# Altium footprint library PCBLIB.PcbLib: 775 footprints (part 19 of 49)
Each footprint in its own frame and in the unit in brackets; x right, y up, seen from the top. Pads: shape width x height; smd on the part's side, far side on the other; paste and mask are expansions set on the pad; w line width, h text height; cw(c..) or ccw(c..) is an arc to the next point about the centre after c.
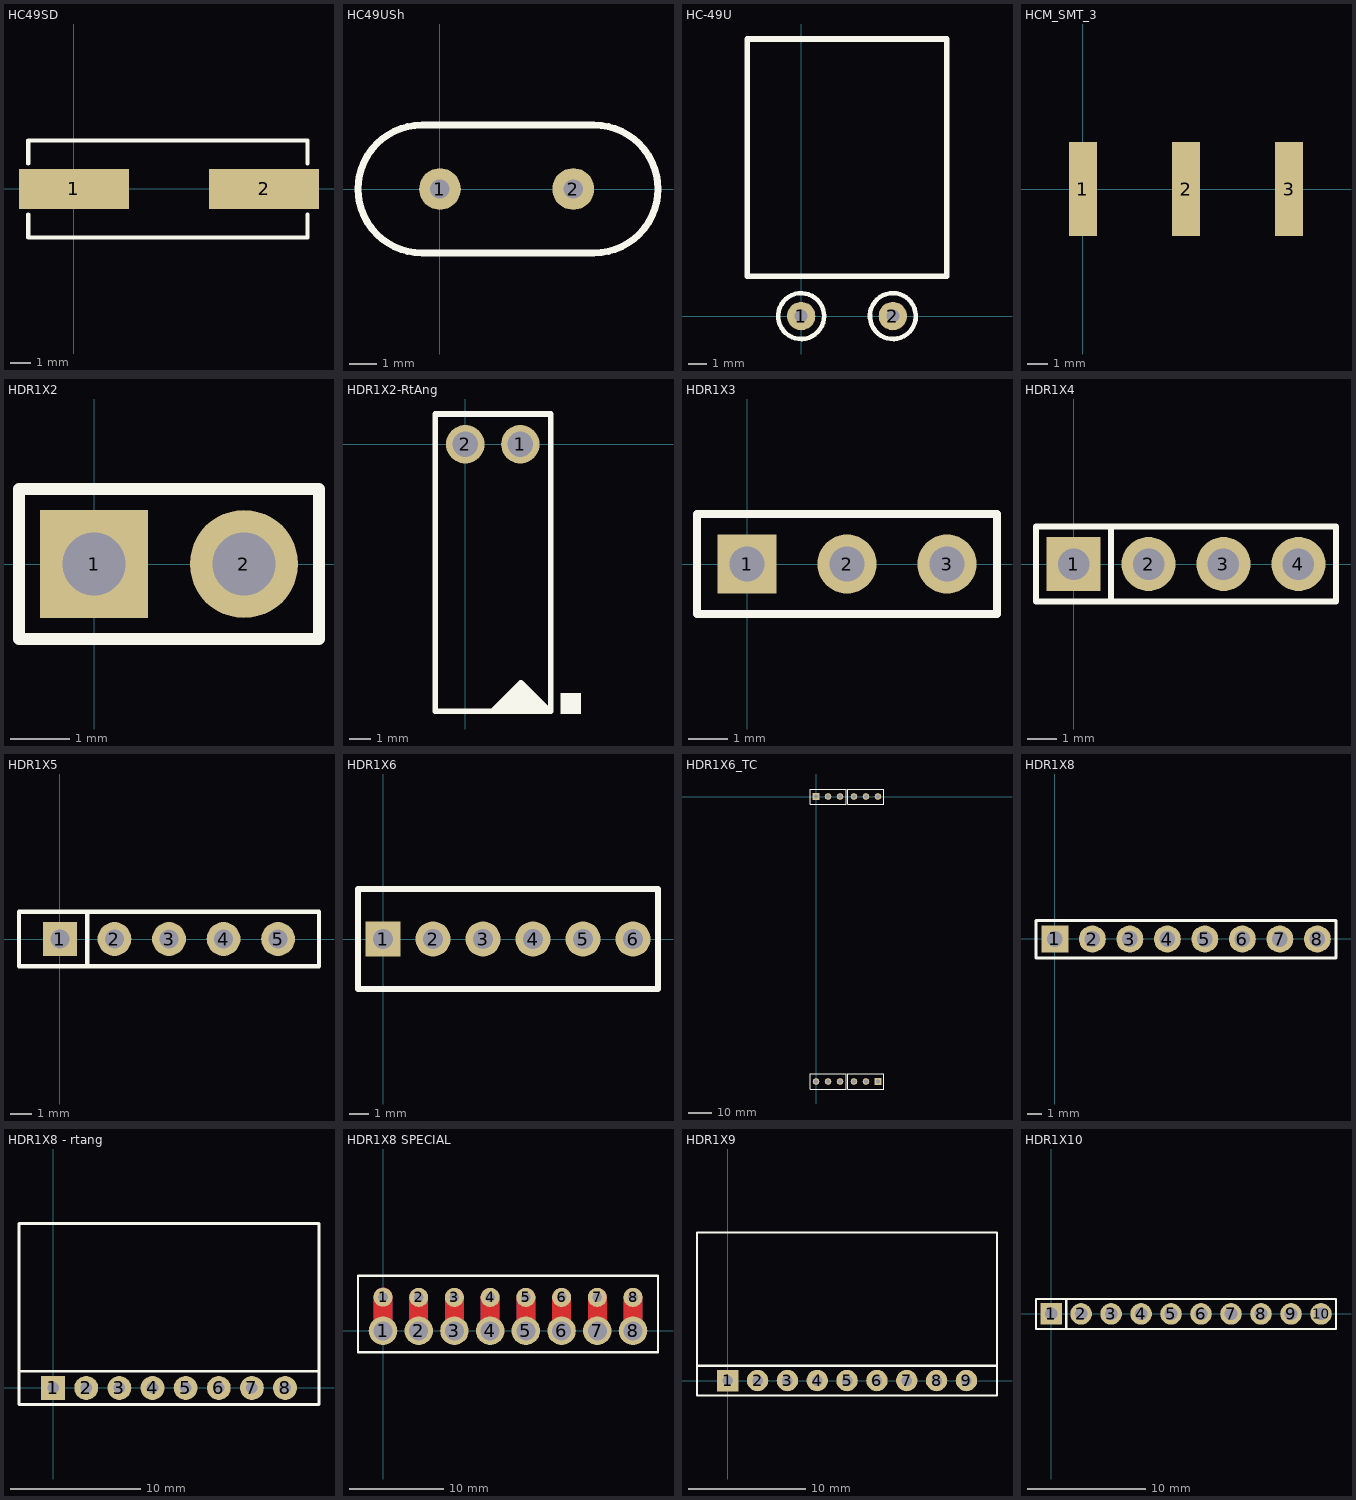
[diagram p18: the footprints below, top view; thin cyan lines are the x and y axes]

## HC49SD [mm]
pads (2):
  rect 5.5x2 smd: 1(0,0) 2(9.5,0)
TopOverlay:
  lines w0.203: -2.286,-2.42 7.544,-2.42 11.684,-2.42 11.684,-1.27 ; -2.286,-2.395 -2.286,-1.27 ; -2.286,1.27 -2.286,2.395 ; -2.286,2.42 6.782,2.42 11.684,2.42 11.684,1.27

## HC49USh [mil]
pads (2):
  round 60 hole 28: 1(0,0) 2(192,0)
TopOverlay:
  lines w10: -26,-92 cw(c-26,0) -26,92 -4,92 174,92 222,92 cw(c222,0) 222,-92 159,-92 10,-92 -26,-92

## HC-49U [mil]
pads (2):
  round 62 hole 28: 1(0,0) 2(200,0)
TopOverlay:
  circle w10: c0,0 r50
  lines w10: 249.96,1.96 ccw(c200,0) 250,0
  lines w12: -117,87 -117,604 317,604 317,87 -117,87
Mechanical4:
  text ".155" at 0,0 h1

## HCM_SMT_3 [mil] "Through Hole to SMT Connector"
pads (3):
  rect 54x182 smd: 1(0,0) 2(200,0) 3(400,0)
TopOverlay:
  text "." at -6.66,110 h80
  text "." at 193.34,110 h80
  text "." at 393.34,110 h80

## HDR1X2 [mil]
height 390
pads (2):
  rect 72x72 hole 42: 1(0,0)
  round 72 hole 42: 2(100,0)
TopOverlay:
  lines w8: -50,-50 -50,50 150,50 150,-50 -50,-50
Mechanical4:
  text ".341" at 0,0 h1

## HDR1X2-RtAng [mil]
height 275
pads (2):
  round 70 hole 46: 1(100,0) 2(0,0)
TopOverlay:
  rectangle: 173,-490 210,-452
  lines w10: 49,-485 101,-433 153,-485 155,-485 ; 62,-485 62,-484 101,-445 137,-481 79.82,-481 74.8,-481 103.11,-452.69 103.11,-457.11 124,-478 93.82,-478 86.17,-470.35 108.26,-470.35 96.89,-458.98 ; 155,-485 -55,-485 -55,55 155,55 155,-485

## HDR1X3 [mm]
pads (3):
  rect 1.5x1.5 hole 0.9: 1(0,0)
  round 1.5 hole 0.9: 2(2.54,0) 3(5.08,0)
TopOverlay:
  lines w0.2: -1.27,-1.27 6.35,-1.27 6.35,1.27 -1.27,1.27 -1.27,-1.27

## HDR1X4 [mil]
height 390
pads (4):
  rect 72x72 hole 42: 1(0,0)
  round 72 hole 42: 2(100,0) 3(200,0) 4(300,0)
TopOverlay:
  lines w8: 50,-50 50,50 ; -50,-50 -50,50 350,50 350,-50 -50,-50
Mechanical4:
  text ".341" at 0,-0.23 h1
  text ".341" at 0,0 h1

## HDR1X5 [mil]
height 10
pads (5):
  rect 62x62 hole 35: 1(0,0)
  round 62 hole 35: 2(100,0) 3(200,0) 4(300,0) 5(400,0)
TopOverlay:
  lines w8: 50,-50 50,50 ; -75,-50 -75,50 475,50 475,-50 -75,-50
Mechanical4:
  text ".358" at 0,0 h1

## HDR1X6 [mil]
pads (6):
  rect 70x70 hole 40: 1(0,0)
  round 70 hole 40: 2(100,0) 3(200,0) 4(300,0) 5(400,0) 6(500,0)
TopOverlay:
  lines w12: -50,-100 -50,100 550,100 550,-100 -50,-100
Mechanical4:
  text ".4" at 0,0 h1

## HDR1X6_TC [mil]
pads (12):
  rect 110x110 hole 65: 1A(0,0) 1B(1032,-4748)
  round 110 hole 65: 2A(200,0) 2B(832,-4748) 3A(400,0) 3B(632,-4748) 4A(632,0) 4B(400,-4748) 5A(832,0) 5B(200,-4748) 6A(1032,0) 6B(0,-4748)
TopOverlay:
  lines w10: -100,-4873 -100,-4623 500,-4623 500,-4873 -100,-4873 ; -100,-125 -100,125 500,125 500,-125 -100,-125 ; 532,-4873 532,-4623 1132,-4623 1132,-4873 532,-4873 ; 532,-125 532,125 1132,125 1132,-125 532,-125
Mechanical4:
  text ".4" at 1003.5,-4748 h1
  text ".4" at 28.5,0 h1

## HDR1X8 [mil]
height 10
pads (8):
  rect 72x72 hole 42: 1(0,0)
  round 72 hole 42: 2(100,-0.23) 3(200,-0.23) 4(300,-0.23) 5(400,-0.23) 6(500,-0.23) 7(600,-0.23) 8(700,-0.23)
TopOverlay:
  lines w8: -50.25,-50.23 749.75,-50.23 749.75,49.77 -50.25,49.77 -50.25,-50.23
Mechanical4:
  text ".341" at 0,0 h1

## HDR1X8 - rtang [mil]
pads (8):
  rect 72x72 hole 35: 1(0,0)
  round 72 hole 35: 2(100,-0.23) 3(200,-0.23) 4(300,-0.23) 5(400,-0.23) 6(500,-0.23) 7(600,-0.23) 8(700,-0.23)
TopOverlay:
  lines w8: -102.99,49.77 802.48,49.77 ; -102.99,-50.23 802.48,-50.23 802.48,496.06 -102.99,496.06 -102.99,-50.23
Mechanical4:
  text ".341" at 0,0 h1

## HDR1X8 SPECIAL [mil]
height 10
pads (16):
  round 120 hole 80: 1(0,0) 2(150,0) 3(300,0) 4(450,0) 5(600,0) 6(750,0) 7(900,0) 8(1050,0)
  round 80 hole 40: 1(0,141) 2(150,140) 3(300,140) 4(450,140) 5(600,140) 6(750,140) 7(900,140) 8(1050,140)
TopLayer:
  lines w80: 0,0 0,141 ; 150,0 150,140 ; 300,0 300,140 ; 450,0 450,140 ; 600,0 600,140 ; 750,0 750,140 ; 900,0 900,140 ; 1050,0 1050,140
BottomLayer:
  lines w80: 0,0 0,141 ; 150,0 150,140 ; 300,0 300,140 ; 450,0 450,140 ; 600,0 600,140 ; 750,0 750,140 ; 900,0 900,140 ; 1050,0 1050,140
TopOverlay:
  lines w10: -105,-89.5 -105,230.5 1155,230.5 1155,-89.5 -105,-89.5
TopPaste:
  lines w80: 0,0 0,141 ; 150,0 150,140 ; 300,0 300,140 ; 450,0 450,140 ; 600,0 600,140 ; 750,0 750,140 ; 900,0 900,140 ; 1050,0 1050,140
BottomPaste:
  lines w80: 0,0 0,141 ; 150,0 150,140 ; 300,0 300,140 ; 450,0 450,140 ; 600,0 600,140 ; 750,0 750,140 ; 900,0 900,140 ; 1050,0 1050,140
TopSolder:
  lines w80: 0,0 0,141 ; 150,0 150,140 ; 300,0 300,140 ; 450,0 450,140 ; 600,0 600,140 ; 750,0 750,140 ; 900,0 900,140 ; 1050,0 1050,140
BottomSolder:
  lines w80: 0,-4.81 0,141 ; 150,0 150,140 ; 300,0 300,140 ; 450,0 450,140 ; 600,0 600,140 ; 750,0 750,140 ; 900,0 900,140 ; 1050,0 1050,140

## HDR1X9 [mil]
pads (9):
  rect 72x72 hole 35: 1(0,0)
  round 72 hole 35: 2(100,-0.23) 3(200,-0.23) 4(300,-0.23) 5(400,-0.23) 6(500,-0.23) 7(600,-0.23) 8(700,-0.23) 9(800,-0.23)
TopOverlay:
  lines w8: -102.99,49.77 802.48,49.77 901.23,49.77 ; -102.99,-50.23 802.48,-50.23 902.48,-50.23 902.48,496.06 802.48,496.06 -102.99,496.06 -102.99,-50.23
Mechanical4:
  text ".341" at 0,0 h1

## HDR1X10 [mil]
height 0.01
pads (10):
  rect 72x72 hole 42: 1(0,0)
  round 72 hole 42: 2(100,0) 3(200,0) 4(300,0) 5(400,0) 6(500,0) 7(600,0) 8(700,0) 9(800,0) 10(900,0)
TopOverlay:
  lines w8: 50,-50.23 50,49.77 ; -50.25,-50.23 -50.25,49.77 24.75,49.77 950,49.77 950,-50.23 -50.25,-50.23
Mechanical4:
  text ".341" at 0,0 h1